# Altium footprint library WR-TBL_Pluggable PCB Header.PcbLib: 719 footprints (part 24 of 45)
Each footprint in its own frame and in the unit in brackets; x right, y up, seen from the top. Pads: shape width x height; smd on the part's side, far side on the other; paste and mask are expansions set on the pad; w line width, h text height; cw(c..) or ccw(c..) is an arc to the next point about the centre after c.
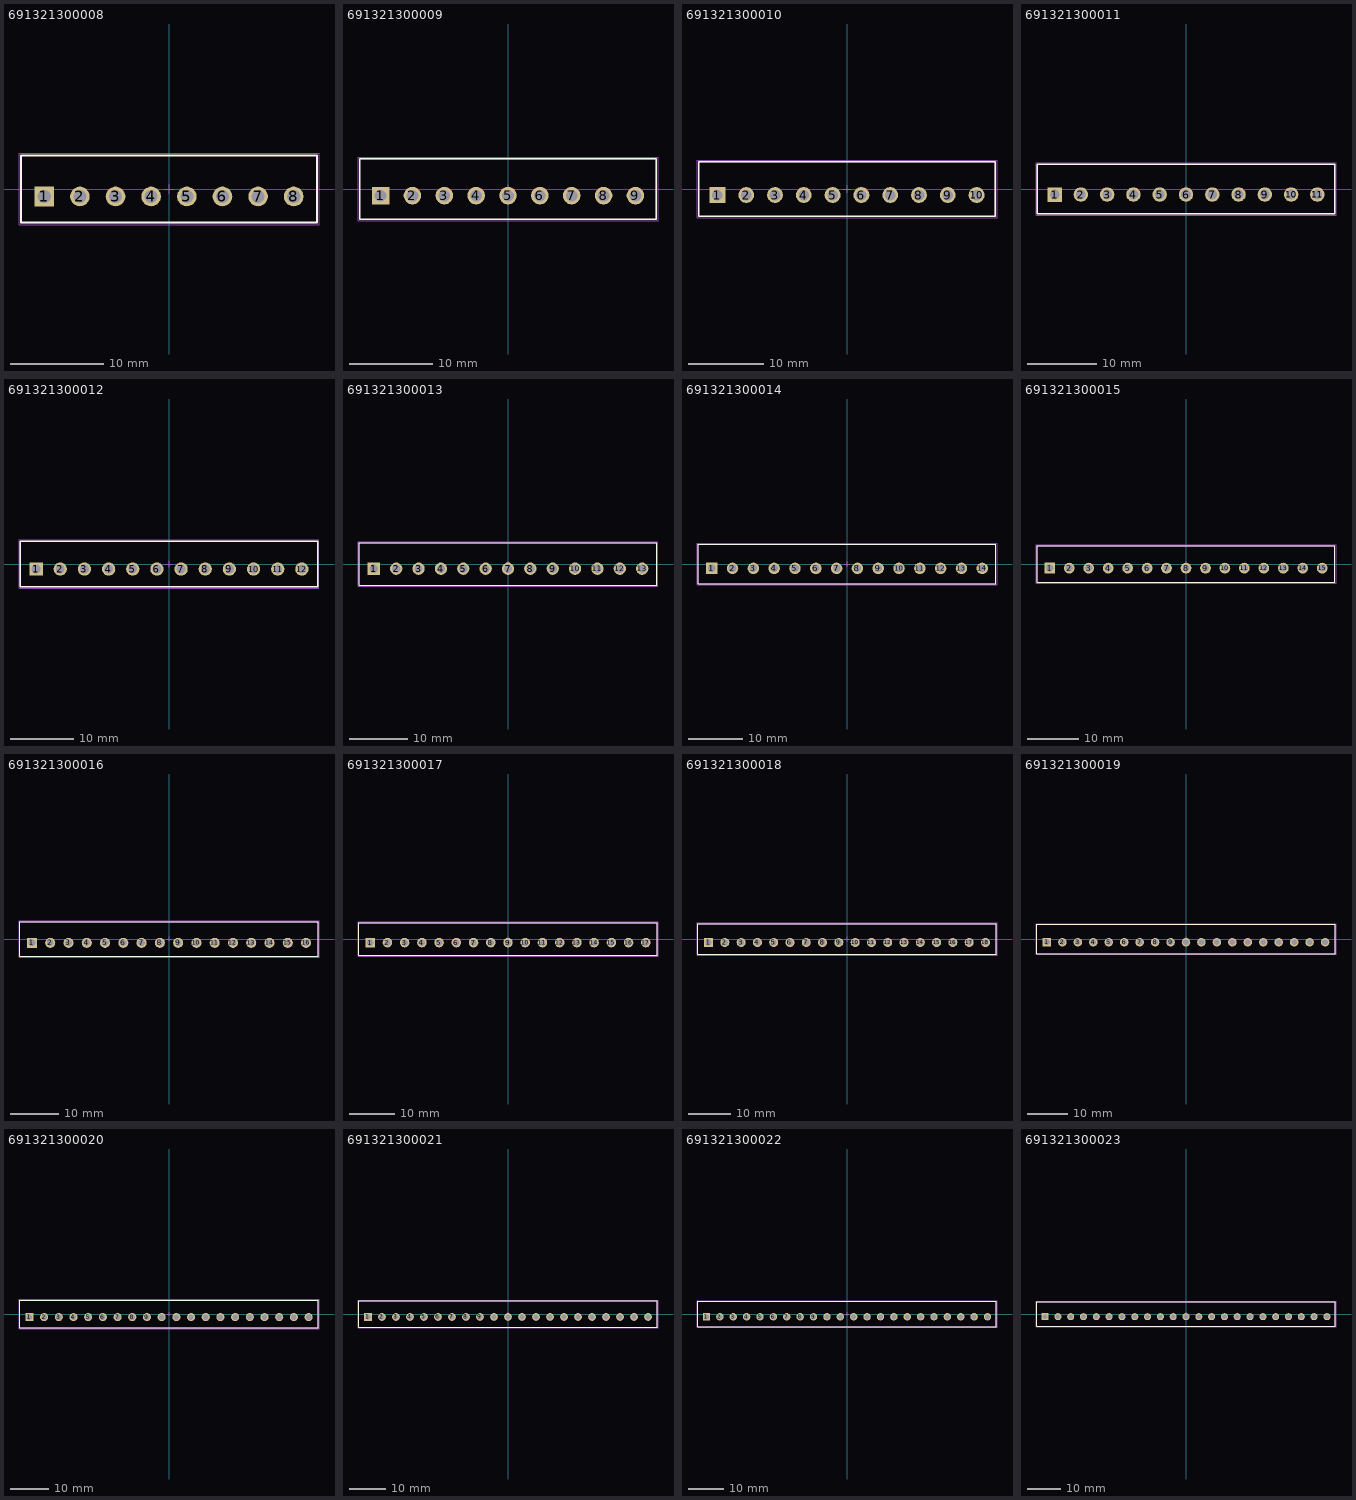
[diagram p23: the footprints below, top view; thin cyan lines are the x and y axes]

## 691321300008 [mm] "Vertical PCB Header, pitch 3.81mm, 08p"
height 9.2
pads (8):
  rect 2.1x2.1 hole 1.4: 1(-13.335,-0.8)
  round 2.1 hole 1.4: 2(-9.525,-0.8) 3(-5.715,-0.8) 4(-1.905,-0.8) 5(1.905,-0.8) 6(5.715,-0.8) 7(9.525,-0.8) 8(13.335,-0.8)
Top Overlay:
  lines w0.2: -15.835,-3.6 15.835,-3.6 15.835,3.6 -15.835,3.6 -15.835,-3.6
Mechanical 13:
  lines w0.1: -15.835,-3.6 -15.835,3.6 15.835,3.6 15.835,-3.6 -15.835,-3.6
Mechanical 15:
  lines w0.05: -0.5,0 0.5,0 ; 0,-0.5 0,0.5 ; -16.035,-3.8 -16.035,3.8 16.035,3.8 16.035,-3.8 -16.035,-3.8
3D body "691321300008.stp": height 9.25, standoff -3.45, extent -15.835,-3.6 15.835,3.6

## 691321300009 [mm] "Vertical PCB Header, pitch 3.81mm, 09p"
height 9.2
pads (9):
  rect 2.1x2.1 hole 1.4: 1(-15.24,-0.8)
  round 2.1 hole 1.4: 2(-11.43,-0.8) 3(-7.62,-0.8) 4(-3.81,-0.8) 5(0,-0.8) 6(3.81,-0.8) 7(7.62,-0.8) 8(11.43,-0.8) 9(15.24,-0.8)
Top Overlay:
  lines w0.2: -17.74,-3.6 17.74,-3.6 17.74,3.6 -17.74,3.6 -17.74,-3.6
Mechanical 13:
  lines w0.1: -17.74,-3.6 -17.74,3.6 17.74,3.6 17.74,-3.6 -17.74,-3.6
Mechanical 15:
  lines w0.05: -0.5,0 0.5,0 ; 0,-0.5 0,0.5 ; -17.94,-3.8 -17.94,3.8 17.94,3.8 17.94,-3.8 -17.94,-3.8
3D body "691321300009.stp": height 9.25, standoff -3.45, extent -17.74,-3.6 17.74,3.6

## 691321300010 [mm] "Vertical PCB Header, pitch 3.81mm, 10p"
height 9.2
pads (10):
  rect 2.1x2.1 hole 1.4: 1(-17.145,-0.8)
  round 2.1 hole 1.4: 2(-13.335,-0.8) 3(-9.525,-0.8) 4(-5.715,-0.8) 5(-1.905,-0.8) 6(1.905,-0.8) 7(5.715,-0.8) 8(9.525,-0.8) 9(13.335,-0.8) 10(17.145,-0.8)
Top Overlay:
  lines w0.2: -19.645,-3.6 19.645,-3.6 19.645,3.6 -19.645,3.6 -19.645,-3.6
Mechanical 13:
  lines w0.1: -19.645,-3.6 -19.645,3.6 19.645,3.6 19.645,-3.6 -19.645,-3.6
Mechanical 15:
  lines w0.05: -0.5,0 0.5,0 ; 0,-0.5 0,0.5 ; -19.845,-3.8 -19.845,3.8 19.845,3.8 19.845,-3.8 -19.845,-3.8
3D body "691321300010.stp": height 9.25, standoff -3.45, extent -19.645,-3.6 19.645,3.6

## 691321300011 [mm] "Vertical PCB Header, pitch 3.81mm, 11p"
height 9.2
pads (11):
  rect 2.1x2.1 hole 1.4: 1(-19.05,-0.8)
  round 2.1 hole 1.4: 2(-15.24,-0.8) 3(-11.43,-0.8) 4(-7.62,-0.8) 5(-3.81,-0.8) 6(0,-0.8) 7(3.81,-0.8) 8(7.62,-0.8) 9(11.43,-0.8) 10(15.24,-0.8) 11(19.05,-0.8)
Top Overlay:
  lines w0.2: -21.55,-3.6 21.55,-3.6 21.55,3.6 -21.55,3.6 -21.55,-3.6
Mechanical 13:
  lines w0.1: -21.55,-3.6 -21.55,3.6 21.55,3.6 21.55,-3.6 -21.55,-3.6
Mechanical 15:
  lines w0.05: -0.5,0 0.5,0 ; 0,-0.5 0,0.5 ; -21.75,-3.8 -21.75,3.8 21.75,3.8 21.75,-3.8 -21.75,-3.8
3D body "691321300011.stp": height 9.25, standoff -3.45, extent -21.55,-3.6 21.55,3.6

## 691321300012 [mm] "Vertical PCB Header, pitch 3.81mm, 12p"
height 9.2
pads (12):
  rect 2.1x2.1 hole 1.4: 1(-20.955,-0.8)
  round 2.1 hole 1.4: 2(-17.145,-0.8) 3(-13.335,-0.8) 4(-9.525,-0.8) 5(-5.715,-0.8) 6(-1.905,-0.8) 7(1.905,-0.8) 8(5.715,-0.8) 9(9.525,-0.8) 10(13.335,-0.8) 11(17.145,-0.8) 12(20.955,-0.8)
Top Overlay:
  lines w0.2: -23.455,-3.6 -23.455,3.6 23.455,3.6 23.455,-3.6 -23.455,-3.6
Mechanical 13:
  lines w0.1: -23.455,-3.6 23.455,-3.6 23.455,3.6 -23.455,3.6 -23.455,-3.6
Mechanical 15:
  lines w0.05: -0.5,0 0.5,0 ; 0,-0.5 0,0.5 ; -23.655,-3.8 23.655,-3.8 23.655,3.8 -23.655,3.8 -23.655,-3.8
3D body "691321300012.stp": height 9.25, standoff -3.45, extent -23.455,-3.6 23.455,3.6

## 691321300013 [mm] "Vertical PCB Header, pitch 3.81mm, 13p"
height 9.2
pads (13):
  rect 2.1x2.1 hole 1.4: 1(-22.86,-0.8)
  round 2.1 hole 1.4: 2(-19.05,-0.8) 3(-15.24,-0.8) 4(-11.43,-0.8) 5(-7.62,-0.8) 6(-3.81,-0.8) 7(0,-0.8) 8(3.81,-0.8) 9(7.62,-0.8) 10(11.43,-0.8) 11(15.24,-0.8) 12(19.05,-0.8) 13(22.86,-0.8)
Top Overlay:
  lines w0.2: -25.36,-3.6 -25.36,3.6 25.36,3.6 25.36,-3.6 -25.36,-3.6
Mechanical 13:
  lines w0.1: -25.36,-3.6 25.36,-3.6 25.36,3.6 -25.36,3.6 -25.36,-3.6
Mechanical 15:
  lines w0.05: -0.5,0 0.5,0 ; 0,-0.5 0,0.5 ; -25.56,-3.8 25.56,-3.8 25.56,3.8 -25.56,3.8 -25.56,-3.8
3D body "691321300013.stp": height 9.25, standoff -3.45, extent -25.36,-3.6 25.36,3.6

## 691321300014 [mm] "Vertical PCB Header, pitch 3.81mm, 14p"
height 9.2
pads (14):
  rect 2.1x2.1 hole 1.4: 1(-24.765,-0.8)
  round 2.1 hole 1.4: 2(-20.955,-0.8) 3(-17.145,-0.8) 4(-13.335,-0.8) 5(-9.525,-0.8) 6(-5.715,-0.8) 7(-1.905,-0.8) 8(1.905,-0.8) 9(5.715,-0.8) 10(9.525,-0.8) 11(13.335,-0.8) 12(17.145,-0.8) 13(20.955,-0.8) 14(24.765,-0.8)
Top Overlay:
  lines w0.2: -27.265,-3.6 -27.265,3.6 27.265,3.6 27.265,-3.6 -27.265,-3.6
Mechanical 13:
  lines w0.1: -27.265,-3.6 27.265,-3.6 27.265,3.6 -27.265,3.6 -27.265,-3.6
Mechanical 15:
  lines w0.05: -0.5,0 0.5,0 ; 0,-0.5 0,0.5 ; -27.465,-3.8 27.465,-3.8 27.465,3.8 -27.465,3.8 -27.465,-3.8
3D body "691321300014.stp": height 9.25, standoff -3.45, extent -27.265,-3.6 27.265,3.6

## 691321300015 [mm] "Vertical PCB Header, pitch 3.81mm, 15p"
height 9.2
pads (15):
  rect 2.1x2.1 hole 1.4: 1(-26.67,-0.8)
  round 2.1 hole 1.4: 2(-22.86,-0.8) 3(-19.05,-0.8) 4(-15.24,-0.8) 5(-11.43,-0.8) 6(-7.62,-0.8) 7(-3.81,-0.8) 8(0,-0.8) 9(3.81,-0.8) 10(7.62,-0.8) 11(11.43,-0.8) 12(15.24,-0.8) 13(19.05,-0.8) 14(22.86,-0.8) 15(26.67,-0.8)
Top Overlay:
  lines w0.2: -29.17,-3.6 -29.17,3.6 29.17,3.6 29.17,-3.6 -29.17,-3.6
Mechanical 13:
  lines w0.1: -29.17,-3.6 29.17,-3.6 29.17,3.6 -29.17,3.6 -29.17,-3.6
Mechanical 15:
  lines w0.05: -0.5,0 0.5,0 ; 0,-0.5 0,0.5 ; -29.37,-3.8 29.37,-3.8 29.37,3.8 -29.37,3.8 -29.37,-3.8
3D body "691321300015.stp": height 9.25, standoff -3.45, extent -29.17,-3.6 29.17,3.6

## 691321300016 [mm] "Vertical PCB Header, pitch 3.81mm, 16p"
height 9.2
pads (16):
  rect 2.1x2.1 hole 1.4: 1(-28.575,-0.8)
  round 2.1 hole 1.4: 2(-24.765,-0.8) 3(-20.955,-0.8) 4(-17.145,-0.8) 5(-13.335,-0.8) 6(-9.525,-0.8) 7(-5.715,-0.8) 8(-1.905,-0.8) 9(1.905,-0.8) 10(5.715,-0.8) 11(9.525,-0.8) 12(13.335,-0.8) 13(17.145,-0.8) 14(20.955,-0.8) 15(24.765,-0.8) 16(28.575,-0.8)
Top Overlay:
  lines w0.2: -31.075,-3.6 -31.075,3.6 31.075,3.6 31.075,-3.6 -31.075,-3.6
Mechanical 13:
  lines w0.1: -31.075,-3.6 31.075,-3.6 31.075,3.6 -31.075,3.6 -31.075,-3.6
Mechanical 15:
  lines w0.05: -0.5,0 0.5,0 ; 0,-0.5 0,0.5 ; -31.275,-3.8 31.275,-3.8 31.275,3.8 -31.275,3.8 -31.275,-3.8
3D body "691321300016.stp": height 9.25, standoff -3.45, extent -31.075,-3.6 31.075,3.6

## 691321300017 [mm] "Vertical PCB Header, pitch 3.81mm, 17p"
height 9.2
pads (17):
  rect 2.1x2.1 hole 1.4: 1(-30.48,-0.8)
  round 2.1 hole 1.4: 2(-26.67,-0.8) 3(-22.86,-0.8) 4(-19.05,-0.8) 5(-15.24,-0.8) 6(-11.43,-0.8) 7(-7.62,-0.8) 8(-3.81,-0.8) 9(0,-0.8) 10(3.81,-0.8) 11(7.62,-0.8) 12(11.43,-0.8) 13(15.24,-0.8) 14(19.05,-0.8) 15(22.86,-0.8) 16(26.67,-0.8) 17(30.48,-0.8)
Top Overlay:
  lines w0.2: -32.98,-3.6 32.98,-3.6 32.98,3.6 -32.98,3.6 -32.98,-3.6
Mechanical 13:
  lines w0.1: -32.98,-3.6 -32.98,3.6 32.98,3.6 32.98,-3.6 -32.98,-3.6
Mechanical 15:
  lines w0.05: -0.5,0 0.5,0 ; 0,-0.5 0,0.5 ; -33.18,-3.8 -33.18,3.8 33.18,3.8 33.18,-3.8 -33.18,-3.8
3D body "691321300017.stp": height 9.25, standoff -3.45, extent -32.98,-3.6 32.98,3.6

## 691321300018 [mm] "Vertical PCB Header, pitch 3.81mm, 18p"
height 9.2
pads (18):
  rect 2.1x2.1 hole 1.4: 1(-32.385,-0.8)
  round 2.1 hole 1.4: 2(-28.575,-0.8) 3(-24.765,-0.8) 4(-20.955,-0.8) 5(-17.145,-0.8) 6(-13.335,-0.8) 7(-9.525,-0.8) 8(-5.715,-0.8) 9(-1.905,-0.8) 10(1.905,-0.8) 11(5.715,-0.8) 12(9.525,-0.8) 13(13.335,-0.8) 14(17.145,-0.8) 15(20.955,-0.8) 16(24.765,-0.8) 17(28.575,-0.8) 18(32.385,-0.8)
Top Overlay:
  lines w0.2: -34.885,-3.6 -34.885,3.6 34.885,3.6 34.885,-3.6 -34.885,-3.6
Mechanical 13:
  lines w0.1: -34.885,-3.6 34.885,-3.6 34.885,3.6 -34.885,3.6 -34.885,-3.6
Mechanical 15:
  lines w0.05: -0.5,0 0.5,0 ; 0,-0.5 0,0.5 ; -35.085,-3.8 35.085,-3.8 35.085,3.8 -35.085,3.8 -35.085,-3.8
3D body "691321300018.stp": height 9.25, standoff -3.45, extent -34.885,-3.6 34.885,3.6

## 691321300019 [mm] "Vertical PCB Header, pitch 3.81mm, 19p"
height 9.2
pads (19):
  rect 2.1x2.1 hole 1.4: 1(-34.29,-0.8)
  round 2.1 hole 1.4: 2(-30.48,-0.8) 3(-26.67,-0.8) 4(-22.86,-0.8) 5(-19.05,-0.8) 6(-15.24,-0.8) 7(-11.43,-0.8) 8(-7.62,-0.8) 9(-3.81,-0.8) 10(0,-0.8) 11(3.81,-0.8) 12(7.62,-0.8) 13(11.43,-0.8) 14(15.24,-0.8) 15(19.05,-0.8) 16(22.86,-0.8) 17(26.67,-0.8) 18(30.48,-0.8) 19(34.29,-0.8)
Top Overlay:
  lines w0.2: -36.79,-3.6 -36.79,3.6 36.79,3.6 36.79,-3.6 -36.79,-3.6
Mechanical 13:
  lines w0.1: -36.79,-3.6 36.79,-3.6 36.79,3.6 -36.79,3.6 -36.79,-3.6
Mechanical 15:
  lines w0.05: -0.5,0 0.5,0 ; 0,-0.5 0,0.5 ; -36.99,-3.8 36.99,-3.8 36.99,3.8 -36.99,3.8 -36.99,-3.8
3D body "691321300019.stp": height 9.25, standoff -3.45, extent -36.79,-3.6 36.79,3.6

## 691321300020 [mm] "Vertical PCB Header, pitch 3.81mm, 20p"
height 9.2
pads (20):
  rect 2.1x2.1 hole 1.4: 1(-36.195,-0.8)
  round 2.1 hole 1.4: 2(-32.385,-0.8) 3(-28.575,-0.8) 4(-24.765,-0.8) 5(-20.955,-0.8) 6(-17.145,-0.8) 7(-13.335,-0.8) 8(-9.525,-0.8) 9(-5.715,-0.8) 10(-1.905,-0.8) 11(1.905,-0.8) 12(5.715,-0.8) 13(9.525,-0.8) 14(13.335,-0.8) 15(17.145,-0.8) 16(20.955,-0.8) 17(24.765,-0.8) 18(28.575,-0.8) 19(32.385,-0.8) 20(36.195,-0.8)
Top Overlay:
  lines w0.2: -38.695,-3.6 -38.695,3.6 38.695,3.6 38.695,-3.6 -38.695,-3.6
Mechanical 13:
  lines w0.1: -38.695,-3.6 38.695,-3.6 38.695,3.6 -38.695,3.6 -38.695,-3.6
Mechanical 15:
  lines w0.05: -0.5,0 0.5,0 ; 0,-0.5 0,0.5 ; -38.895,-3.8 38.895,-3.8 38.895,3.8 -38.895,3.8 -38.895,-3.8
3D body "691321300020.stp": height 9.25, standoff -3.45, extent -38.695,-3.6 38.695,3.6

## 691321300021 [mm] "Vertical PCB Header, pitch 3.81mm, 21p"
height 9.2
pads (21):
  rect 2.1x2.1 hole 1.4: 1(-38.1,-0.8)
  round 2.1 hole 1.4: 2(-34.29,-0.8) 3(-30.48,-0.8) 4(-26.67,-0.8) 5(-22.86,-0.8) 6(-19.05,-0.8) 7(-15.24,-0.8) 8(-11.43,-0.8) 9(-7.62,-0.8) 10(-3.81,-0.8) 11(0,-0.8) 12(3.81,-0.8) 13(7.62,-0.8) 14(11.43,-0.8) 15(15.24,-0.8) 16(19.05,-0.8) 17(22.86,-0.8) 18(26.67,-0.8) 19(30.48,-0.8) 20(34.29,-0.8) 21(38.1,-0.8)
Top Overlay:
  lines w0.2: -40.6,-3.6 -40.6,3.6 40.6,3.6 40.6,-3.6 -40.6,-3.6
Mechanical 13:
  lines w0.1: -40.6,-3.6 40.6,-3.6 40.6,3.6 -40.6,3.6 -40.6,-3.6
Mechanical 15:
  lines w0.05: -0.5,0 0.5,0 ; 0,-0.5 0,0.5 ; -40.8,-3.8 40.8,-3.8 40.8,3.8 -40.8,3.8 -40.8,-3.8
3D body "691321300021.stp": height 9.25, standoff -3.45, extent -40.6,-3.6 40.6,3.6

## 691321300022 [mm] "Vertical PCB Header, pitch 3.81mm, 22p"
height 9.2
pads (22):
  rect 2.1x2.1 hole 1.4: 1(-40.005,-0.8)
  round 2.1 hole 1.4: 2(-36.195,-0.8) 3(-32.385,-0.8) 4(-28.575,-0.8) 5(-24.765,-0.8) 6(-20.955,-0.8) 7(-17.145,-0.8) 8(-13.335,-0.8) 9(-9.525,-0.8) 10(-5.715,-0.8) 11(-1.905,-0.8) 12(1.905,-0.8) 13(5.715,-0.8) 14(9.525,-0.8) 15(13.335,-0.8) 16(17.145,-0.8) 17(20.955,-0.8) 18(24.765,-0.8) 19(28.575,-0.8) 20(32.385,-0.8) 21(36.195,-0.8) 22(40.005,-0.8)
Top Overlay:
  lines w0.2: -42.505,-3.6 42.505,-3.6 42.505,3.6 -42.505,3.6 -42.505,-3.6
Mechanical 13:
  lines w0.1: -42.505,-3.6 -42.505,3.6 42.505,3.6 42.505,-3.6 -42.505,-3.6
Mechanical 15:
  lines w0.05: -0.5,0 0.5,0 ; 0,-0.5 0,0.5 ; -42.705,-3.8 -42.705,3.8 42.705,3.8 42.705,-3.8 -42.705,-3.8
3D body "691321300022.stp": height 9.25, standoff -3.45, extent -42.505,-3.6 42.505,3.6

## 691321300023 [mm] "Vertical PCB Header, pitch 3.81mm, 23p"
height 9.2
pads (23):
  rect 2.1x2.1 hole 1.4: 1(-41.91,-0.8)
  round 2.1 hole 1.4: 2(-38.1,-0.8) 3(-34.29,-0.8) 4(-30.48,-0.8) 5(-26.67,-0.8) 6(-22.86,-0.8) 7(-19.05,-0.8) 8(-15.24,-0.8) 9(-11.43,-0.8) 10(-7.62,-0.8) 11(-3.81,-0.8) 12(0,-0.8) 13(3.81,-0.8) 14(7.62,-0.8) 15(11.43,-0.8) 16(15.24,-0.8) 17(19.05,-0.8) 18(22.86,-0.8) 19(26.67,-0.8) 20(30.48,-0.8) 21(34.29,-0.8) 22(38.1,-0.8) 23(41.91,-0.8)
Top Overlay:
  lines w0.2: -44.41,-3.6 44.41,-3.6 44.41,3.6 -44.41,3.6 -44.41,-3.6
Mechanical 13:
  lines w0.1: -44.41,-3.6 -44.41,3.6 44.41,3.6 44.41,-3.6 -44.41,-3.6
Mechanical 15:
  lines w0.05: -0.5,0 0.5,0 ; 0,-0.5 0,0.5 ; -44.61,-3.8 -44.61,3.8 44.61,3.8 44.61,-3.8 -44.61,-3.8
3D body "691321300023.stp": height 9.25, standoff -3.45, extent -44.41,-3.6 44.41,3.6